# Altium schematic symbol library AA_Symbols.SchLib: 1017 symbols (part 6 of 7) (continued)
## Res_12.0k_0603_1% (continued)
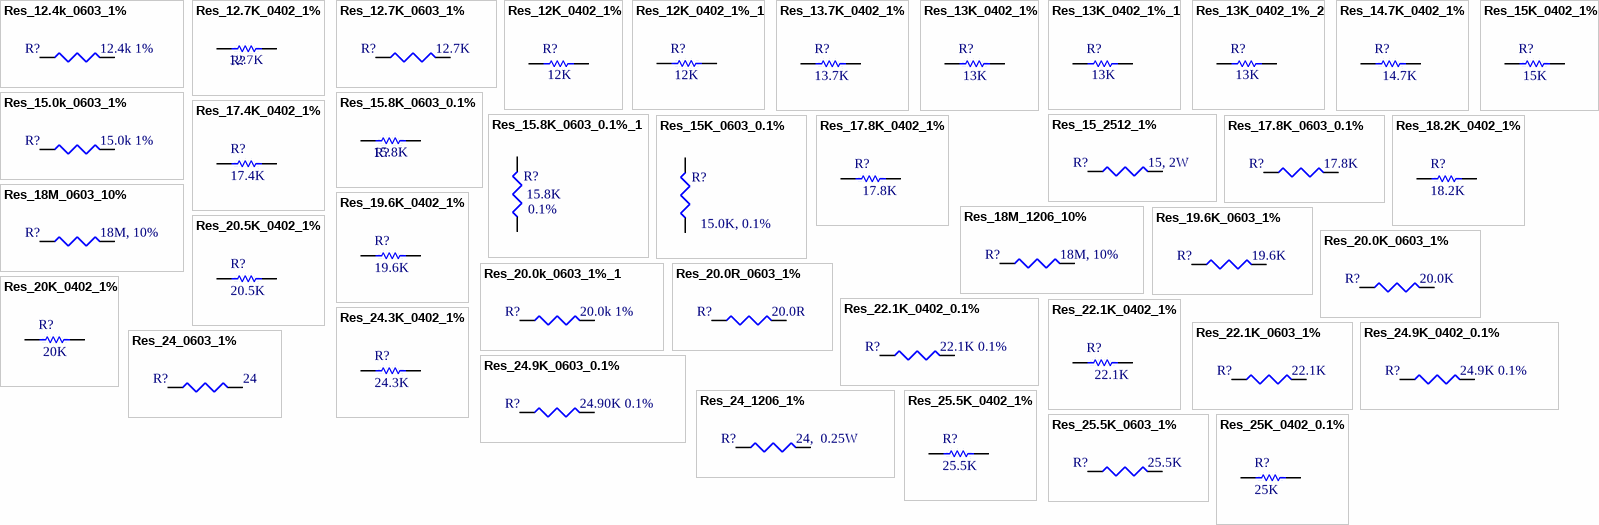
[diagram p34: symbols Res_12.4k_0603_1% to Res_25K_0402_0.1%]

## Res_12.4k_0603_1%
designator R?, comment 12.4k 1%
Resistor, 12.4k, 0603, 1%; Manufacturer: Stackpole; Manufacturer P/N: RMCF0603FT12K4; Outset P/N: PN-0001739; Value: 12.4k 1%
footprint RC_1608_0603_N (Chip Resistor, 2-Leads, Body 1.5x0.8mm, IPC Medium Density)
pins: 1, 2

## Res_12.7K_0402_1%
designator R?, comment 12.7K
Resistor, 12.7K, 0402, 1%, 1/10W; Manufacturer P/N: ERJ-2RKF1272X; Manufacturer: Panasonic-ECG; Outset P/N: PN-0007089; TempCo: 100ppm/C; TOLERANCE: 1%; POWER: 1/10W; Value: 12.7K
footprint RC_1005_0402_L
pins: 1, 2

## Res_12.7K_0603_1%
designator R?, comment 12.7K
Resistor, 12.7K, 0603, 1%; Manufacturer: Stackpole; Manufacturer P/N: RMCF0603FT12K7; Outset P/N: 0000244; Value: 12.7K
footprint RC_1608_0603_N
pins: 1, 2

## Res_12K_0402_1%
designator R?, comment 12K
Resistor, 12K, 0402, 1%, 1/10W; Manufacturer P/N: ERJ-2RKF1202X; Manufacturer: Panasonic-ECG; Outset P/N: PN-0007242; TempCo: 100ppm/C; TOLERANCE: 1%; POWER: 1/10W; Value: 12K
footprint RC_1005_0402_L
footprint RC_1005_0402_N
pins: 1, 2

## Res_12K_0402_1%_1
designator R?, comment value 12K  (hidden comment: 12K0)
Resistor, 12K, 0402, 1%, 1/10W; Manufacturer P/N: ERJ-2RKF1202X; Manufacturer: Panasonic-ECG; Outset P/N: PN-0007088; TempCo: 100ppm/C; TOLERANCE: 1%; POWER: 1/10W
footprint RC_1005_0402_L
pins: 1, 2

## Res_13.7K_0402_1%
designator R?, comment 13.7K
Resistor, 13.7K, 0402, 1%, 1/10W; Manufacturer P/N: ERJ-2RKF1372X; Manufacturer: Panasonic-ECG; Outset P/N: PN-0007090; TempCo: 100ppm/C; TOLERANCE: 1%; POWER: 1/10W; Value: 13.7K
footprint RC_1005_0402_L
pins: 1, 2

## Res_13K_0402_1%
designator R?, comment 13K
Resistor, 13K, 0402, 1%, 1/10W; Manufacturer P/N: ERJ-2RKF1302X; Manufacturer: Panasonic; Outset P/N: PN-0007178; TempCo: 100ppm/C; TOLERANCE: 1%; POWER: 1/10W; Value: 13K
footprint RC_1005_0402_L
pins: 1, 2

## Res_13K_0402_1%_1
designator R?, comment 13K
Resistor, 13K, 0402, 1%, 1/10W; Manufacturer P/N: ERJ-2RKF1302X; Manufacturer: Panasonic-ECG; Outset P/N: PN-0007178; TempCo: 100ppm/C; TOLERANCE: 1%; POWER: 1/10W; Value: 13K
footprint RC_1005_0402_L
footprint RC_1005_0402_N
pins: 1, 2

## Res_13K_0402_1%_2
designator R?, comment 13K
Resistor, 13K, 0402, 1%, 1/10W; Manufacturer P/N: ERJ-2RKF1302X; Manufacturer: Panasonic-ECG; TempCo: 100ppm/C; TOLERANCE: 1%; POWER: 1/10W; Value: 13K
footprint RC_1005_0402_L
footprint RC_1005_0402_N
pins: 1, 2

## Res_14.7K_0402_1%
designator R?, comment 14.7K
Resistor, 14.7K, 0402, 1%, 1/10W; Manufacturer P/N: ERJ-2RKF1472X; Manufacturer: Panasonic; Outset P/N: PN-0007179; TempCo: 100ppm/C; TOLERANCE: 1%; POWER: 1/10W; Value: 14.7K
footprint RC_1005_0402_L
pins: 1, 2

## Res_15.0k_0603_1%
designator R?, comment 15.0k 1%
Resistor, 15.0k, 0603, 1%; Manufacturer: Stackpole; Manufacturer P/N: RMCF0603FT15K0; Outset P/N: PN-0001751; Value: 15.0k 1%
footprint RC_1608_0603_N (Chip Resistor, 2-Leads, Body 1.5x0.8mm, IPC Medium Density)
pins: 1, 2

## Res_15.8K_0603_0.1%
designator R?, comment 15.8K
Resistor, 15.8K, 0603, 0.1%, 1/5W; Manufacturer P/N: ERJ-PB3B1582V; Manufacturer: Panasonic; Outset P/N: PN-0008340; POWER: 0.2W; TempCo: 50ppm/C; TOLERANCE: 0.1%; Value: 15.8K
footprint RC_1608_0603_N (Chip Resistor, 2-Leads, Body 1.5x0.8mm, IPC Medium Density)
pins: 1, 2

## Res_15.8K_0603_0.1%_1
designator R?, comment TOLERANCE: 0.1%  (hidden comment: 15.8K)
Resistor, 15.8K, 0603, 0.1%; Manufacturer: Panasonic; Manufacturer P/N: ERJ-PB3B1582V; Outset P/N: PN-0008348; Value: 15.8K
footprint RC_1608_0603_L (Chip Resistor, 2-Leads, Body 1.5x0.8mm, IPC Least Density)
pins: 1, 2

## Res_15_2512_1%
designator R?, comment 15, 2W
Resistor, 15, 2512, 1%, 2W; Manufacturer: Stackpole Electronics Inc; Manufacturer P/N: RHC2512FT15R0; Outset P/N: 0000249; Value: 15, 2W
footprint RC_6332_2512_N (Chip Resistor, 2-Leads, Body 6.3x3.2mm, IPC Medium Density)
pins: 1, 2

## Res_15K_0402_1%
designator R?, comment 15K
Resistor, 15K, 0402, 1%, 1/10W; Manufacturer P/N: ERJ-2RKF1502X; Manufacturer: Panasonic-ECG; Outset P/N: PN-0007091; TempCo: 100ppm/C; TOLERANCE: 1%; POWER: 1/10W; Value: 15K
footprint RC_1005_0402_L
pins: 1, 2

## Res_15K_0603_0.1%
designator R?, comment 15.0K, 0.1%
Resistor, 15K, 0603, 0.1%; Manufacturer: Stackpole Electronics Inc; Manufacturer P/N: RNCS0603BKE15K0; Outset P/N: 0000248; Value: 15.0K, 0.1%
footprint RC_1608_0603_N
pins: 1, 2

## Res_17.4K_0402_1%
designator R?, comment 17.4K
Resistor, 17.4K, 0402, 1%, 1/10W; Manufacturer P/N: ERJ-2RKF1742X; Manufacturer: Panasonic-ECG; TempCo: 100ppm/C; Outset P/N: PN-0007220; POWER: 1/10W; TOLERANCE: 1%; VALUE: 17.4K
footprint RC_1005_0402_L
pins: 1, 2

## Res_17.8K_0402_1%
designator R?, comment 17.8K
Resistor, 17.8K, 0402, 1%, 1/10W; Manufacturer P/N: ERJ-2RKF1782X; Manufacturer: Panasonic; Outset P/N: PN-0007180; TempCo: 100ppm/C; TOLERANCE: 1%; POWER: 1/10W; Value: 17.8K
footprint RC_1005_0402_L
pins: 1, 2

## Res_17.8K_0603_0.1%
designator R?, comment 17.8K
Resistor, 17.8K, 0603, 0.1%, 0.15W; Manufacturer: TE Connectivity; Manufacturer P/N: RQ73C1J17K8BTD; TempCo: 10ppm/C; Outset P/N: PN-0008324; POWER: 0.15W; TOLERANCE: 0.1%; Value: 17.8K
footprint RC_1608_0603_L (Chip Resistor, 2-Leads, Body 1.5x0.8mm, IPC Least Density)
pins: 1, 2

## Res_18.2K_0402_1%
designator R?, comment 18.2K
Resistor, 18.2K, 0402, 1%, 1/10W; Manufacturer P/N: ERJ-2RKF1822X; Manufacturer: Panasonic-ECG; Outset P/N: PN-0007092; TempCo: 100ppm/C; TOLERANCE: 1%; POWER: 1/10W; Value: 18.2K
footprint RC_1005_0402_L
pins: 1, 2

## Res_18M_0603_10%
designator R?, comment 18M, 10%
Resistor, 18M, 0603, 10%; Manufacturer: Panasonic; Manufacturer P/N: ERJ-3GEYK186V; Outset P/N: PN-0001670; Value: 18M, 10%
footprint RC_1608_0603_N (Chip Resistor, 2-Leads, Body 1.5x0.8mm, IPC Medium Density)
pins: 1, 2

## Res_18M_1206_10%
designator R?, comment 18M, 10%
Resistor, 18M, 1206, 10%; Manufacturer: Panasonic; Manufacturer P/N: ERJ-8GEYK186V; Outset P/N: PN-0001671; Value: 18M, 10%
footprint RC_3216_1206_N (Chip Resistor, 2-Leads, Body 3.2x1.6mm, IPC Medium Density)
pins: 1, 2

## Res_19.6K_0402_1%
designator R?, comment 19.6K
Resistor, 19.6K, 0402, 1%, 1/10W; Manufacturer P/N: ERJ-2RKF1962X; Manufacturer: Panasonic-ECG; Outset P/N: PN-0007093; TempCo: 100ppm/C; TOLERANCE: 1%; POWER: 1/10W; Value: 19.6K
footprint RC_1005_0402_L
pins: 1, 2

## Res_19.6K_0603_1%
designator R?, comment 19.6K
Resistor, 19.6K, 0603, 1%; Manufacturer: Stackpole Electronics Inc; Manufacturer P/N: RMCF0603FT19K6; Outset P/N: PN-0003016; Value: 19.6K
footprint RC_1608_0603_N
pins: 1, 2

## Res_20.0K_0603_1%
designator R?, comment 20.0K
Resistor, 20.0K, 0603, 1%; Manufacturer: Stackpole Electronics Inc; Manufacturer P/N: RMCF0603FT20K0; Outset P/N: 0000257; Value: 20.0K
footprint RC_1608_0603_N
pins: 1, 2

## Res_20.0k_0603_1%_1
designator R?, comment 20.0k 1%
Resistor, 20.0k, 0603, 1%; Manufacturer: Panasonic; Manufacturer P/N: ERJ3EKF2002V; Outset P/N: PN-0002767; Value: 20.0k 1%
footprint RC_1608_0603_N (Chip Resistor, 2-Leads, Body 1.5x0.8mm, IPC Medium Density)
pins: 1, 2

## Res_20.0R_0603_1%
designator R?, comment 20.0R
Resistor, 20.0R, 0603, 1%; Manufacturer: Stackpole; Manufacturer P/N: RMCF0603FT20R0; Outset P/N: PN-0002775; Value: 20.0R
footprint RC_1608_0603_N
pins: 1, 2

## Res_20.5K_0402_1%
designator R?, comment 20.5K
Resistor, 20.5K, 0402, 1%, 1/10W; Manufacturer P/N: ERJ-2RKF2052X; Manufacturer: Panasonic-ECG; TempCo: 100ppm/C; Outset P/N: PN-0007221; POWER: 1/10W; TOLERANCE: 1%; VALUE: 20.5K
footprint RC_1005_0402_L
pins: 1, 2

## Res_20K_0402_1%
designator R?, comment 20K
Resistor, 20K, 0402, 1%, 1/10W; Manufacturer P/N: ERJ-2RKF2002X; Manufacturer: Panasonic-ECG; Outset P/N: PN-0007094; TempCo: 100ppm/C; TOLERANCE: 1%; POWER: 1/10W; Value: 20K
footprint RC_1005_0402_L
pins: 1, 2

## Res_22.1K_0402_0.1%
designator R?, comment 22.1K 0.1%
Resistor, 22.1K, 0402, 0.1%; Manufacturer: Yageo; Manufacturer P/N: RT0402BRE0722K1L; Outset P/N: PN-0005549; Value: 22.1K 0.1%
footprint RC_1005_0402_N (Chip Resistor, 2-Leads, Body 1.0x0.5mm, IPC Medium Density)
pins: 1, 2

## Res_22.1K_0402_1%
designator R?, comment 22.1K
Resistor, 22.1K, 0402, 1%, 1/10W; Manufacturer P/N: ERJ-2RKF2212X; Manufacturer: Panasonic; Outset P/N: PN-0007183; TempCo: 100ppm/C; TOLERANCE: 1%; POWER: 1/10W; Value: 22.1K
footprint RC_1005_0402_L
pins: 1, 2

## Res_22.1K_0603_1%
designator R?, comment 22.1K
Resistor, 22.1K, 0603, 1%; Manufacturer: Stackpole; Manufacturer P/N: RMCF0603FT22K1; Outset P/N: 0000262; Value: 22.1K
footprint RC_1608_0603_N
pins: 1, 2

## Res_24.3K_0402_1%
designator R?, comment 24.3K
Resistor, 24.3K, 0402, 1%, 1/10W; Manufacturer P/N: ERJ-2RKF2432X; Manufacturer: Panasonic-ECG; Outset P/N: PN-0007095; TempCo: 100ppm/C; TOLERANCE: 1%; POWER: 1/10W; Value: 24.3K
footprint RC_1005_0402_L
pins: 1, 2

## Res_24.9K_0402_0.1%
designator R?, comment 24.9K 0.1%
Resistor, 24.9K, 0402, 0.1%; Manufacturer: Yageo; Manufacturer P/N: RT0402BRD0724K9L; Outset P/N: PN-0001452; Value: 24.9K 0.1%
footprint RC_1005_0402_N (Chip Resistor, 2-Leads, Body 1.0x0.5mm, IPC Medium Density)
pins: 1, 2

## Res_24.9K_0603_0.1%
designator R?, comment 24.90K 0.1%
Resistor, 24.9K, 0603, 0.1%; Manufacturer: Panasonic; Manufacturer P/N: ERA-3AEB2492V; Outset P/N: 0000265; Value: 24.90K 0.1%
footprint RC_1608_0603_N
pins: 1, 2

## Res_24_0603_1%
designator R?, comment 24
Resistor, 24, 0603, 1%; Manufacturer: Vishay Dale; Manufacturer P/N: CRCW060324R0FKEA; Outset P/N: 0000267; Value: 24
footprint RC_1608_0603_N
pins: 1, 2

## Res_24_1206_1%
designator R?, comment 24,  0.25W
Resistor, 24, 1206, 1%, 0.25W; Manufacturer: Vishay Dale; Manufacturer P/N: CRCW120624R0FKEA; Outset P/N: 0000268; Value: 24,  0.25W
footprint RC_3216_1206_N
pins: 1, 2

## Res_25.5K_0402_1%
designator R?, comment 25.5K
Resistor, 25.5K, 0402, 1%, 1/10W; Manufacturer P/N: ERJ-2RKF2552X; Manufacturer: Panasonic-ECG; Outset P/N: PN-0007096; TempCo: 100ppm/C; TOLERANCE: 1%; POWER: 1/10W; Value: 25.5K
footprint RC_1005_0402_L
pins: 1, 2

## Res_25.5K_0603_1%
designator R?, comment 25.5K
Resistor, 25.5K, 0603, 1%; Manufacturer: Stackpole Electronics Inc; Manufacturer P/N: RMCF0603FT25K5; Outset P/N: 0000269; Value: 25.5K
footprint RC_1608_0603_N
pins: 1, 2

## Res_25K_0402_0.1%
designator R?, comment 25K
Resistor, 25K, 0402, 0.1%, 1/20W; Manufacturer P/N: PNM0402E2502BST1; Manufacturer: Vishay Dale; Outset P/N: PN-0007431; TempCo: 25ppm/C; TOLERANCE: 0.1%; POWER: 1/20W; Value: 25K
footprint RC_1005_0402_L
pins: 1, 2

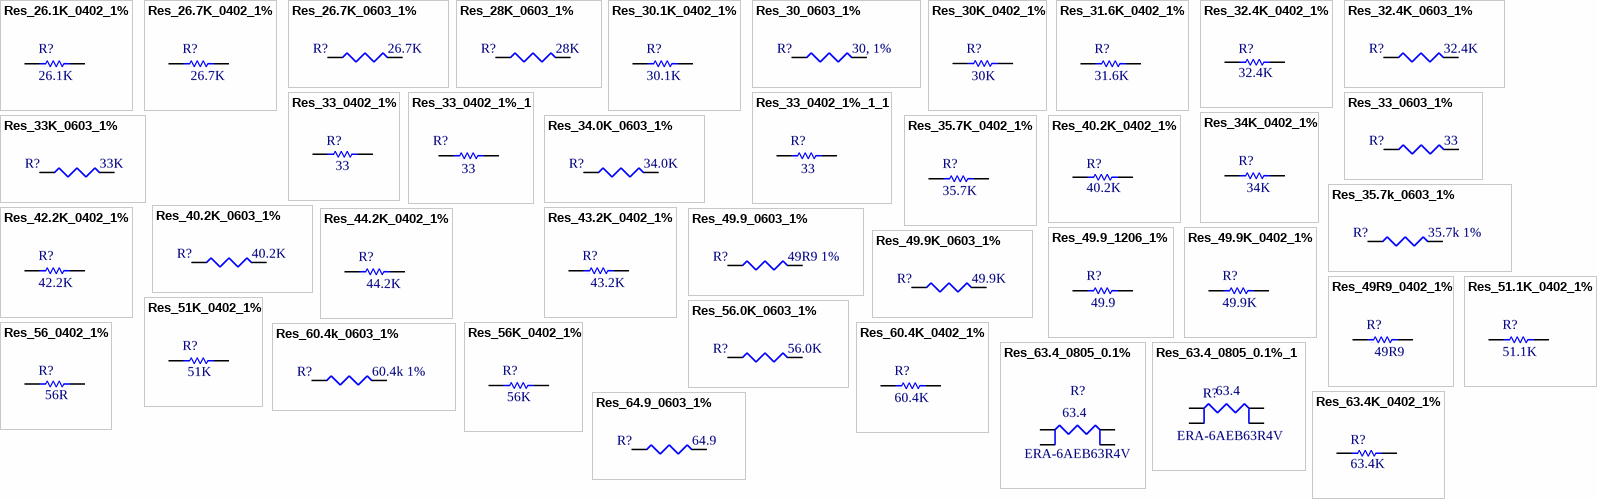
[diagram p35: symbols Res_26.1K_0402_1% to Res_64.9_0603_1%]

## Res_26.1K_0402_1%
designator R?, comment 26.1K
Resistor, 26.1K, 0402, 1%, 1/10W; Manufacturer P/N: ERJ-2RKF2612X; Manufacturer: Panasonic-ECG; Outset P/N: PN-0007097; TempCo: 100ppm/C; TOLERANCE: 1%; POWER: 1/10W; Value: 26.1K
footprint RC_1005_0402_L
pins: 1, 2

## Res_26.7K_0402_1%
designator R?, comment 26.7K
Resistor, 26.7K, 0402, 1%, 1/10W; Manufacturer P/N: ERJ-2RKF2672X; Manufacturer: Panasonic; Outset P/N: PN-0007184; TempCo: 100ppm/C; TOLERANCE: 1%; POWER: 1/10W; Value: 26.7K
footprint RC_1005_0402_L
pins: 1, 2

## Res_26.7K_0603_1%
designator R?, comment 26.7K
Resistor, 26.7K, 0603, 1%; Manufacturer: Stackpole; Manufacturer P/N: RMCF0603FT26K7; Outset P/N: 0000270; Value: 26.7K
footprint RC_1608_0603_N
pins: 1, 2

## Res_28K_0603_1%
designator R?, comment 28K
Resistor, 28K, 0603, 1%; Manufacturer: Panasonic Electronic Components; Manufacturer P/N: ERJ-3EKF2802V; Outset P/N: 0000272; Value: 28K
footprint RC_1608_0603_N
pins: 1, 2

## Res_30.1K_0402_1%
designator R?, comment 30.1K
Resistor, 30.1K, 0402, 1%, 1/10W; Manufacturer P/N: ERJ-2RKF3012X; Manufacturer: Panasonic-ECG; Outset P/N: PN-0007099; TempCo: 100ppm/C; TOLERANCE: 1%; POWER: 1/10W; Value: 30.1K
footprint RC_1005_0402_L
pins: 1, 2

## Res_30_0603_1%
designator R?, comment 30, 1%
Resistor, 30, 0603, 1%; Manufacturer: Stackpole; Manufacturer P/N: RMCF0603FT30R0; Outset P/N: PN-0001778; Value: 30, 1%
footprint RC_1608_0603_N (Chip Resistor, 2-Leads, Body 1.5x0.8mm, IPC Medium Density)
pins: 1, 2

## Res_30K_0402_1%
designator R?, comment 30K
Resistor, 30K, 0402, 1%, 1/10W; Manufacturer P/N: ERJ-2RKF3002X; Manufacturer: Panasonic-ECG; Outset P/N: PN-0007098; TempCo: 100ppm/C; TOLERANCE: 1%; POWER: 1/10W; Value: 30K
footprint RC_1005_0402_L
pins: 1, 2

## Res_31.6K_0402_1%
designator R?, comment 31.6K
Resistor, 31.6K, 0402, 1%, 1/10W; Manufacturer P/N: ERJ-2RKF3162X; Manufacturer: Panasonic-ECG; Outset P/N: PN-0007423; TempCo: 100ppm/C; TOLERANCE: 1%; POWER: 1/10W; Value: 31.6K
footprint RC_1005_0402_L
pins: 1, 2

## Res_32.4K_0402_1%
designator R?, comment 32.4K
Resistor, 32.4K, 0402, 1%, 1/10W; Manufacturer P/N: ERJ-2RKF3242X; Manufacturer: Panasonic-ECG; Outset P/N: PN-0007243; TempCo: 100ppm/C; TOLERANCE: 1%; POWER: 1/10W; Value: 32.4K
footprint RC_1005_0402_L
footprint RC_1005_0402_N
pins: 1, 2

## Res_32.4K_0603_1%
designator R?, comment 32.4K
Resistor, 32.4K, 0603, 1%; Manufacturer: Stackpole Electronics Inc; Manufacturer P/N: RMCF0603FT32K4; Outset P/N: 0000279; Value: 32.4K
footprint RC_1608_0603_N
pins: 1, 2

## Res_33_0402_1%
designator R?, comment 33
Resistor, 33, 0402, 1%, 1/10W; Manufacturer P/N: ERJ-2RKF33R0X; Manufacturer: Panasonic-ECG; Outset P/N: PN-0007227; TOLERANCE: 1%; POWER: 1/10W; Value: 33
footprint RC_1005_0402_L
footprint RC_1005_0402_N
pins: 1, 2

## Res_33_0402_1%_1
designator R?, comment 33
Resistor, 33, 0402, 1%, 1/10W; Manufacturer P/N: ERJ-2RKF33R0X; Manufacturer: Panasonic-ECG; Outset P/N: PN-0007060; TempCo: 100ppm/C; TOLERANCE: 1%; POWER: 1/10W; Value: 33
footprint RC_1005_0402_L
pins: 1, 2

## Res_33_0402_1%_1_1
designator R?, comment 33
Resistor, 33, 0402, 1%, 1/16W; Manufacturer: Yageo; Manufacturer P/N: AC0402FR-0733RL; TempCo: 100ppm/C; Outset P/N: PN-0007054; TYPE: Thick Film Chip Resistor; TOLERANCE: 1%; POWER: 1/16W; VALUE: 33
footprint RC_1005_0402_L
pins: 1, 2

## Res_33_0603_1%
designator R?, comment 33
Resistor, 33, 0603, 1%; Manufacturer: Stackpole; Manufacturer P/N: RMCF0603FT33R0; Outset P/N: 0000281; Value: 33; Distributor: Digi-Key; Distributor P/N: RMCF0603FT33R0CT-ND; Supplier 1: Digi-Key; Supplier Part Number 1: RMCF0603FT33R0CT-ND
footprint 0603
footprint RC_1608_0603_N
pins: 1, 2

## Res_33K_0603_1%
designator R?, comment 33K
Resistor, 33K, 0603, 1%; Manufacturer: Stackpole; Manufacturer P/N: RMCF0603FT33K0; Outset P/N: 0000280; Value: 33K
footprint RC_1608_0603_N
pins: 1, 2

## Res_34.0K_0603_1%
designator R?, comment 34.0K
Resistor, 34.0K, 0603, 1%; Manufacturer: Stackpole; Manufacturer P/N: RMCF0603FT34K0; Outset P/N: 0000282; Value: 34.0K
footprint RC_1608_0603_N
pins: 1, 2

## Res_34K_0402_1%
designator R?, comment 34K
Resistor, 34K, 0402, 1%, 1/10W; Manufacturer P/N: ERJ-2RKF3402X; Manufacturer: Panasonic; Outset P/N: PN-0007186; TempCo: 100ppm/C; TOLERANCE: 1%; POWER: 1/10W; Value: 34K
footprint RC_1005_0402_L
pins: 1, 2

## Res_35.7K_0402_1%
designator R?, comment 35.7K
Resistor, 35.7K, 0402, 1%, 1/10W; Manufacturer P/N: ERJ-2RKF3572X; Manufacturer: Panasonic-ECG; Outset P/N: PN-0007100; TempCo: 100ppm/C; TOLERANCE: 1%; POWER: 1/10W; Value: 35.7K
footprint RC_1005_0402_L
pins: 1, 2

## Res_35.7k_0603_1%
designator R?, comment 35.7k 1%
Resistor, 35.7k, 0603, 1%; Manufacturer: Stackpole; Manufacturer P/N: RMCF0603FT35K7; Outset P/N: PN-0001769; Value: 35.7k 1%
footprint RC_1608_0603_N (Chip Resistor, 2-Leads, Body 1.5x0.8mm, IPC Medium Density)
pins: 1, 2

## Res_40.2K_0402_1%
designator R?, comment 40.2K
Resistor, 40.2K, 0402, 1%, 1/10W; Manufacturer P/N: ERJ-2RKF4022X; Manufacturer: Panasonic-ECG; Outset P/N: PN-0007477; TempCo: 100ppm/C; TOLERANCE: 1%; POWER: 1/10W; Value: 40.2K
footprint RC_1005_0402_L
footprint RC_1005_0402_N
pins: 1, 2

## Res_40.2K_0603_1%
designator R?, comment 40.2K
Resistor, 40.2K, 0603, 1%; Manufacturer: Stackpole Electronics Inc; Manufacturer P/N: RMCF0603FT40K2; Outset P/N: 0000290; Value: 40.2K
footprint RC_1608_0603_N
pins: 1, 2

## Res_42.2K_0402_1%
designator R?, comment 42.2K
Resistor, 42.2K, 0402, 1%, 1/10W; Manufacturer P/N: ERJ-2RKF4222X; Manufacturer: Panasonic-ECG; Outset P/N: PN-0007101; TempCo: 100ppm/C; TOLERANCE: 1%; POWER: 1/10W; Value: 42.2K
footprint RC_1005_0402_L
pins: 1, 2

## Res_43.2K_0402_1%
designator R?, comment 43.2K
Resistor, 43.2K, 0402, 1%, 1/10W; Manufacturer P/N: ERJ-2RKF4322X; Manufacturer: Panasonic; Outset P/N: PN-0008202; TempCo: 100ppm/C; TOLERANCE: 1%; POWER: 1/10W; Value: 43.2K
footprint RC_1005_0402_L
pins: 1, 2

## Res_44.2K_0402_1%
designator R?, comment 44.2K
Resistor, 44.2K, 0402, 1%, 1/10W; Manufacturer P/N: ERJ-2RKF4422X; Manufacturer: Panasonic; Outset P/N: PN-0007188; TempCo: 100ppm/C; TOLERANCE: 1%; POWER: 1/10W; Value: 44.2K
footprint RC_1005_0402_L
pins: 1, 2

## Res_49.9_0603_1%
designator R?, comment 49R9 1%
Resistor, 49.9 Ohms, 0603, 1%; Manufacturer: Panasonic; Manufacturer P/N: ERJ-3EKF49R9V; Outset P/N: PN-0001731; Value: 49R9 1%
footprint RC_1608_0603_N (Chip Resistor, 2-Leads, Body 1.5x0.8mm, IPC Medium Density)
pins: 1, 2

## Res_49.9_1206_1%
designator R?, comment 49.9
Resistor, 49.9, 1206, 1%, 1/4W; Manufacturer P/N: ERJ-8ENF49R9V; Manufacturer: Panasonic-ECG; Outset P/N: PN-0007122; TempCo: 100ppm/C; TOLERANCE: 1%; POWER: 1/4W; Value: 49.9
footprint RC_3216_1206_N
footprint RC_3216_1206_L
pins: 1, 2

## Res_49.9K_0402_1%
designator R?, comment 49.9K
Resistor, 49.9K, 0402, 1%, 1/10W; Manufacturer P/N: ERJ-2RKF4992X; Manufacturer: Panasonic-ECG; TempCo: 100ppm/C; Outset P/N: PN-0007225; TOLERANCE: 1%; POWER: 1/10W; Value: 49.9K
footprint RC_1005_0402_L
pins: 1, 2

## Res_49.9K_0603_1%
designator R?, comment 49.9K
Resistor, 49.9K, 0603, 1%; Manufacturer: Stackpole Electronics Inc; Manufacturer P/N: RMCF0603FT49K9; Outset P/N: 0000294; Value: 49.9K
footprint RC_1608_0603_N
pins: 1, 2

## Res_49R9_0402_1%
designator R?, comment 49R9
Resistor, 49R9, 0402, 1%, 1/16W; Manufacturer P/N: RC0402FR-0749R9L; Manufacturer: YAGEO; Outset P/N: PN-0008218; TempCo: 100ppm/C; TOLERANCE: 1%; POWER: 1/16W; Supplier 1: Digi-Key; Supplier Part Number 1: 311-49.9LRTR-ND; Value: 49R9
footprint RC_1005_0402_L
pins: 1, 2

## Res_51.1K_0402_1%
designator R?, comment 51.1K
Resistor, 51.1K, 0402, 1%, 1/10W; Manufacturer: Panasonic-ECG; Manufacturer P/N: ERJ-2RKF5112X; TempCo: 100ppm/C; Outset P/N: PN-0007222; TOLERANCE: 1%; POWER: 1/10W; VALUE: 51.1K
footprint RC_1005_0402_L
pins: 1, 2

## Res_51K_0402_1%
designator R?, comment 51K
Resistor, 51K, 0402, 1%, 1/10W; Manufacturer P/N: ERJ-2RKF5102X; Manufacturer: Panasonic-ECG; Outset P/N: PN-0007244; TempCo: 100ppm/C; TOLERANCE: 1%; POWER: 1/10W; Value: 51K
footprint RC_1005_0402_L
footprint RC_1005_0402_N
pins: 1, 2

## Res_56.0K_0603_1%
designator R?, comment 56.0K
Resistor, 56.0K, 0603, 1%; Manufacturer: Stackpole; Manufacturer P/N: RMCF0603FT56K0; Outset P/N: 0000297; Value: 56.0K
footprint RC_1608_0603_N
pins: 1, 2

## Res_56_0402_1%
designator R?, comment 56R
Resistor, 56, 0402, 1%, 1/10W; Manufacturer P/N: ERJ-2RKF56R0X; Manufacturer: Panasonic-ECG; TempCo: 100ppm/C; TOLERANCE: 1%; POWER: 1/10W; Value: 56R
footprint RC_1005_0402_L
footprint RC_1005_0402_N
pins: 1, 2

## Res_56K_0402_1%
designator R?, comment 56K
Resistor, 56K, 0402, 1%, 1/10W; Manufacturer P/N: ERJ-2RKF5602X; Manufacturer: Panasonic-ECG; Outset P/N: PN-0007102; TempCo: 100ppm/C; TOLERANCE: 1%; POWER: 1/10W; Value: 56K
footprint RC_1005_0402_L
pins: 1, 2

## Res_60.4K_0402_1%
designator R?, comment 60.4K
Resistor, 60.4K, 0402, 1%, 1/10W; Manufacturer P/N: ERJ-2RKF6042X; Manufacturer: Panasonic-ECG; Outset P/N: PN-0007103; TempCo: 100ppm/C; TOLERANCE: 1%; POWER: 1/10W; Value: 60.4K
footprint RC_1005_0402_L
pins: 1, 2

## Res_60.4k_0603_1%
designator R?, comment 60.4k 1%
Resistor, 60.4K, 0603, 1%; Manufacturer: Stackpole; Manufacturer P/N: RMCF0603FT60K4; Outset P/N: PN-0001770; Value: 60.4k 1%
footprint RC_1608_0603_N (Chip Resistor, 2-Leads, Body 1.5x0.8mm, IPC Medium Density)
pins: 1, 2

## Res_63.4_0805_0.1%
designator R?, comment Manufacturer P/N: ERA-6AEB63R4V  (hidden comment: 63.4)
Resistor,63.4, 0805, 0.1%, 1/8W; Manufacturer: Panasonic Electronic Components; TOLERANCE: 0.1%; POWER: 1/8W; VALUE: 63.4
footprint RC_3216_1206_N_CUR_SENSE
pins: 1,2, 3,4, S1, S2

## Res_63.4_0805_0.1%_1
designator R?, comment Manufacturer P/N: ERA-6AEB63R4V  (hidden comment: 63.4)
Resistor, 63.4, 0805, 0.1%, 1/8W; Manufacturer: Panasonic Electronic Components; Outset P/N: PN-0007283; TempCo: 25ppm/C; POWER: 1/8W; TOLERANCE: 0.1%; VALUE: 63.4
footprint RC_3216_1206_N_CUR_SENSE
pins: 1,2, 3,4, S1, S2

## Res_63.4K_0402_1%
designator R?, comment 63.4K
Resistor, 63.4K, 0402, 1%, 1/10W; Manufacturer P/N: ERJ-2RKF6342X; Manufacturer: Panasonic-ECG; Outset P/N: PN-0007245; TempCo: 100ppm/C; POWER: 1/10W; TOLERANCE: 1%; Value: 63.4K
footprint RC_1005_0402_L
footprint RC_1005_0402_N
pins: 1, 2

## Res_64.9_0603_1%
designator R?, comment 64.9
Resistor, 64.9, 0603, 1%; Manufacturer: Stackpole; Manufacturer P/N: RMCF0603FT64R9; Outset P/N: 0000301; Value: 64.9
footprint RC_1608_0603_N
pins: 1, 2

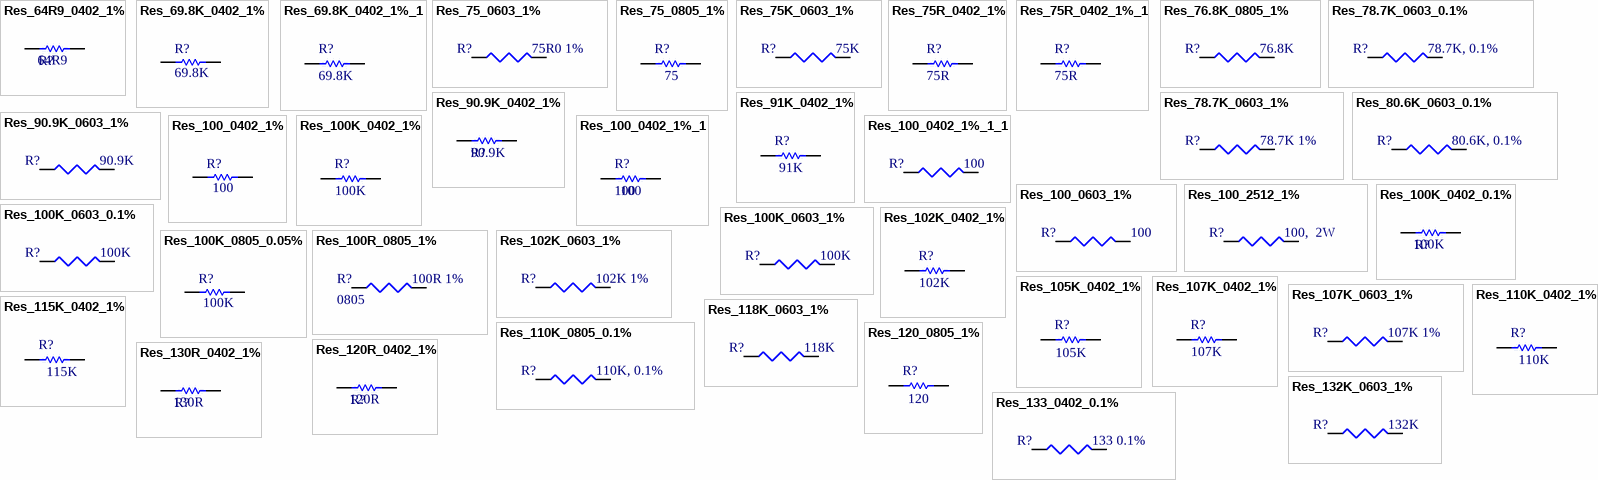
[diagram p36: symbols Res_64R9_0402_1% to Res_133_0402_0.1%]

## Res_64R9_0402_1%
designator R?, comment 64R9
Resistor, 64.9R, 0402, 1%, 1/16W; Manufacturer P/N: RC0402FR-0764R9L; Manufacturer: Yageo; TempCo: 100ppm/C; TOLERANCE: 1%; POWER: 1/16W; Value: 64R9
footprint RC_1005_0402_L
pins: 1, 2

## Res_69.8K_0402_1%
designator R?, comment 69.8K
Resistor, 69.8K, 0402, 1%, 1/10W; Manufacturer P/N: ERJ-2RKF6982X; Manufacturer: Panasonic-ECG; Outset P/N: PN-0007246; TempCo: 100ppm/C; TOLERANCE: 1%; POWER: 1/10W; Value: 69.8K
footprint RC_1005_0402_L
footprint RC_1005_0402_N
pins: 1, 2

## Res_69.8K_0402_1%_1
designator R?, comment 69.8K
Resistor, 69.8K, 0402, 1%, 1/10W; Manufacturer P/N: ERJ-2RKF6982X; Manufacturer: Panasonic-ECG; Outset P/N: PN-0007104; TempCo: 100ppm/C; TOLERANCE: 1%; POWER: 1/10W; Value: 69.8K
footprint RC_1005_0402_L
pins: 1, 2

## Res_75_0603_1%
designator R?, comment 75R0 1%
Resistor, 75 Ohms, 0603, 1%; Manufacturer: Panasonic; Manufacturer P/N: ERJ-3EKF75R0V; Outset P/N: PN-0001732; Value: 75R0 1%
footprint RC_1608_0603_N (Chip Resistor, 2-Leads, Body 1.5x0.8mm, IPC Medium Density)
pins: 1, 2

## Res_75_0805_1%
designator R?, comment 75
Resistor, 75, 0805, 1%, 1/8W; Manufacturer P/N: ERJ-6ENF75R0V; Manufacturer: Panasonic-ECG; TempCo: 100ppm/C; Outset P/N: PN-0007120; TOLERANCE: 1%; POWER: 1/8W; Value: 75
footprint RC_2012_0805_N
footprint RC_2012_0805_L
pins: 1, 2

## Res_75K_0603_1%
designator R?, comment 75K
Resistor, 75K, 0603, 1%; Manufacturer: Stackpole Electronics Inc; Manufacturer P/N: RMCF0603FT75K0; Outset P/N: 0000303; Value: 75K
footprint RC_1608_0603_N
pins: 1, 2

## Res_75R_0402_1%
designator R?, comment 75R
Resistor, 75R, 0402, 1%, 1/10W; Manufacturer P/N: ERJ-2RKF75R0X; Manufacturer: Panasonic-ECG; Outset P/N: PN-0008384; TempCo: 100ppm/C; TOLERANCE: 1%; POWER: 1/10W; Value: 75R
footprint RC_1005_0402_L
pins: 1, 2

## Res_75R_0402_1%_1
designator R?, comment 75R
Resistor, 75R, 0402, 1%, 1/10W; Manufacturer P/N: ERJ-2RKF75R0X; Manufacturer: Panasonic-ECG; TempCo: 100ppm/C; TOLERANCE: 1%; POWER: 1/10W; Value: 75R
footprint RC_1005_0402_L
pins: 1, 2

## Res_76.8K_0805_1%
designator R?, comment 76.8K
Resistor, 76.8K, 0805, 1%; Manufacturer: Panasonic; Manufacturer P/N: ERJ-6ENF7682V; Outset P/N: PN-0003756; Value: 76.8K
footprint RC_2012_0805_N (Chip Resistor, 2-Leads, Body 2.0x1.3mm, IPC Medium Density)
pins: 1, 2

## Res_78.7K_0603_0.1%
designator R?, comment 78.7K, 0.1%
Resistor, 78.7K, 0603, 0.1%; Manufacturer: Panasonic - ERA; Manufacturer P/N: ERA-3AEB7872V; Outset P/N: 0000304; Value: 78.7K, 0.1%
footprint RC_1608_0603_N
pins: 1, 2

## Res_78.7K_0603_1%
designator R?, comment 78.7K 1%
Resistor, 78.7K, 0603, 1%; Manufacturer: Panasonic; Manufacturer P/N: ERJ3EKF7872V; Outset P/N: PN-0002764; Value: 78.7K 1%
footprint RC_1608_0603_N (Chip Resistor, 2-Leads, Body 1.5x0.8mm, IPC Medium Density)
pins: 1, 2

## Res_80.6K_0603_0.1%
designator R?, comment 80.6K, 0.1%
Resistor, 80.6K, 0603, 0.1%; Manufacturer: Panasonic - ERA; Manufacturer P/N: ERA-3AEB8062V; Outset P/N: 0000307; Value: 80.6K, 0.1%
footprint RC_1608_0603_N
pins: 1, 2

## Res_90.9K_0402_1%
designator R?, comment 90.9K
Resistor, 90.9K, 0402, 1%, 1/10W; Manufacturer P/N: ERJ-2RKF9092X; Manufacturer: Panasonic-ECG; Outset P/N: PN-0007105; TempCo: 100ppm/C; TOLERANCE: 1%; POWER: 1/10W; Value: 90.9K
footprint RC_1005_0402_L
pins: 1, 2

## Res_90.9K_0603_1%
designator R?, comment 90.9K
Resistor, 90.9K, 0603, 1%; Manufacturer: Stackpole; Manufacturer P/N: RMCF0603FT90K9; Outset P/N: 0000312; Value: 90.9K
footprint RC_1608_0603_N (Chip Resistor, 2-Leads, Body 1.5x0.8mm, IPC Medium Density)
pins: 1, 2

## Res_91K_0402_1%
designator R?, comment 91K
Resistor, 91K, 0402, 1%, 1/10W; Manufacturer P/N: ERJ-2RKF9102X; Manufacturer: Panasonic-ECG; Outset P/N: PN-0007106; TempCo: 100ppm/C; TOLERANCE: 1%; POWER: 1/10W; Value: 91K
footprint RC_1005_0402_L
pins: 1, 2

## Res_100_0402_1%
designator R?, comment 100
Resistor, 100, 0402, 1%, 1/10W; Manufacturer P/N: ERJ-2RKF1000X; Manufacturer: Panasonic-ECG; Outset P/N: PN-0007228; TempCo: 100ppm/C; TOLERANCE: 1%; POWER: 1/10W; Value: 100
footprint RC_1005_0402_L
footprint RC_1005_0402_N
pins: 1, 2

## Res_100_0402_1%_1
designator R?, comment 100
Resistor, 100, 0402, 1%, 1/16W; Manufacturer P/N: ERJ-2RKF1000X; Manufacturer: Panasonic-ECG; Outset P/N: PN-0007061; TempCo: 100ppm/C; TOLERANCE: 1%; POWER: 1/16W; Value: 100
footprint RC_1005_0402_L
pins: 1, 2

## Res_100_0402_1%_1_1
designator R?, comment 100
Resistor, 100, 0402, 1%; Manufacturer: Yageo; Manufacturer P/N: RC0402FR-07100RL; Outset P/N: PN-0001453; Value: 100
footprint RC_1005_0402_N (Chip Resistor, 2-Leads, Body 1.0x0.5mm, IPC Medium Density)
pins: 1, 2

## Res_100_0603_1%
designator R?, comment 100
Resistor, 100, 0603, 1%; Manufacturer: Stackpole; Manufacturer P/N: RMCF0603FT100R; Outset P/N: 0000237; Value: 100
footprint RC_1608_0603_N
pins: 1, 2

## Res_100_2512_1%
designator R?, comment 100,  2W
Resistor, 100, 2512, 1%, 2W; Manufacturer: Stackpole; Manufacturer P/N: RHC2512FT100R; Outset P/N: 0000238; Value: 100,  2W
footprint RC_6332_2512_N (Chip Resistor, 2-Leads, Body 6.3x3.2mm, IPC Medium Density)
pins: 1, 2

## Res_100K_0402_0.1%
designator R?, comment 100K
Resistor, 100K, 0402, 0.1%, 1/16W; Manufacturer P/N: RT0402BRE07100KL; Manufacturer: YAGEO; TempCo: 50ppm/C; Outset P/N: *; TOLERANCE: 0.1%; POWER: 1/16W; Value: 100K
footprint RC_1005_0402_L
pins: 1, 2

## Res_100K_0402_1%
designator R?, comment 100K
Resistor, 100K, 0402, 1%, 1/10W; Manufacturer P/N: ERJ-2RKF1003X; Manufacturer: Panasonic-ECG; Outset P/N: PN-0007107; TempCo: 100ppm/C; TOLERANCE: 1%; POWER: 1/10W; Value: 100K
footprint RC_1005_0402_L
pins: 1, 2

## Res_100K_0603_0.1%
designator R?, comment 100K
Resistor, 100K, 0603, 0.1%; Manufacturer: Panasonic - ERA; Manufacturer P/N: ERA-3AEB104V; Outset P/N: 0000234; TOLERANCE: 0.1%; Value: 100K
footprint RC_1608_0603_L (Chip Resistor, 2-Leads, Body 1.5x0.8mm, IPC Least Density)
pins: 1, 2

## Res_100K_0603_1%
designator R?, comment 100K
Resistor, 100K, 0603, 1%; Manufacturer: Stackpole; Manufacturer P/N: RMCF0603FT100K; Outset P/N: 0000235; Value: 100K
footprint RC_1608_0603_N
pins: 1, 2

## Res_100K_0805_0.05%
designator R?, comment 100K
Resistor, 100K, 0805, 0.05%, 1/8W; Manufacturer P/N: RG2012N-104-W-T1; Manufacturer: Susumu; Outset P/N: PN-0007428; TempCo: 10ppm/C; POWER: 1/8W; TOLERANCE: 0.05%; Value: 100K
footprint RC_2012_0805_N
pins: 1, 2

## Res_100R_0805_1%
designator R?, comment Size: 0805  (hidden comment: 100R 1%)
Resistor, 100, 0805, 1%; Manufacturer: Panasonic; Manufacturer P/N: ERJ-P06F1000V; Outset P/N: PN-0001706; Value: 100R 1%
footprint RC_2012_0805_N (Chip Resistor, 2-Leads, Body 2.0x1.3mm, IPC Medium Density)
pins: 1, 2

## Res_102K_0402_1%
designator R?, comment 102K
Resistor, 102K, 0402, 1%, 1/10W; Manufacturer P/N: ERJ-2RKF1023X; Manufacturer: Panasonic-ECG; Outset P/N: PN-0007108; TempCo: 100ppm/C; TOLERANCE: 1%; POWER: 1/10W; Value: 102K
footprint RC_1005_0402_L
pins: 1, 2

## Res_102K_0603_1%
designator R?, comment 102K 1%
Resistor, 102K, 0603, 1%; Manufacturer: Panasonic; Manufacturer P/N: ERJ3EKF1023V; Outset P/N: PN-0002765; Value: 102K 1%
footprint RC_1608_0603_N (Chip Resistor, 2-Leads, Body 1.5x0.8mm, IPC Medium Density)
pins: 1, 2

## Res_105K_0402_1%
designator R?, comment 105K
Resistor, 105K, 0402, 1%, 1/10W; Manufacturer P/N: ERJ-2RKF1053X; Manufacturer: Panasonic-ECG; Outset P/N: PN-0007109; TempCo: 100ppm/C; TOLERANCE: 1%; POWER: 1/10W; Value: 105K
footprint RC_1005_0402_L
pins: 1, 2

## Res_107K_0402_1%
designator R?, comment 107K
Resistor, 107K, 0402, 1%, 1/10W; Manufacturer P/N: ERJ-2RKF1073X; Manufacturer: Panasonic-ECG; Outset P/N: PN-0007110; TempCo: 100ppm/C; TOLERANCE: 1%; POWER: 1/10W; Value: 107K
footprint RC_1005_0402_L
pins: 1, 2

## Res_107K_0603_1%
designator R?, comment 107K 1%
Resistor, 107K, 0603, 1%; Manufacturer: Panasonic; Manufacturer P/N: ERJ3EKF1073V; Outset P/N: PN-0002763; Value: 107K 1%
footprint RC_1608_0603_N (Chip Resistor, 2-Leads, Body 1.5x0.8mm, IPC Medium Density)
pins: 1, 2

## Res_110K_0402_1%
designator R?, comment 110K
Resistor, 110K, 0402, 1%, 1/16W; Manufacturer P/N: RC0402FR-07110KL; Manufacturer: YAGEO; Outset P/N: PN-0008203; TempCo: 100ppm/C; TOLERANCE: 1%; POWER: 1/16W; Value: 110K
footprint RC_1005_0402_L
pins: 1, 2

## Res_110K_0805_0.1%
designator R?, comment 110K, 0.1%
Resistor, 110K, 0805, 0.1%; Manufacturer: Panasonic Electronic Components; Manufacturer P/N: ERA-6AEB114V; Outset P/N: 0000242; Value: 110K, 0.1%
footprint RC_2012_0805_N
pins: 1, 2

## Res_115K_0402_1%
designator R?, comment 115K
Resistor, 115K, 0402, 1%, 1/16W; Manufacturer P/N: CRCW0402115KFKED; Manufacturer: Vishay Dale; Outset P/N: PN-0008170; TempCo: 100ppm/C; TOLERANCE: 1%; POWER: 1/16W; Value: 115K
footprint RC_1005_0402_L
pins: 1, 2